# Altium schematic symbol library Sang_library.SchLib: 1607 symbols (part 4 of 15) (continued)
## BIG_Header 4 (continued)
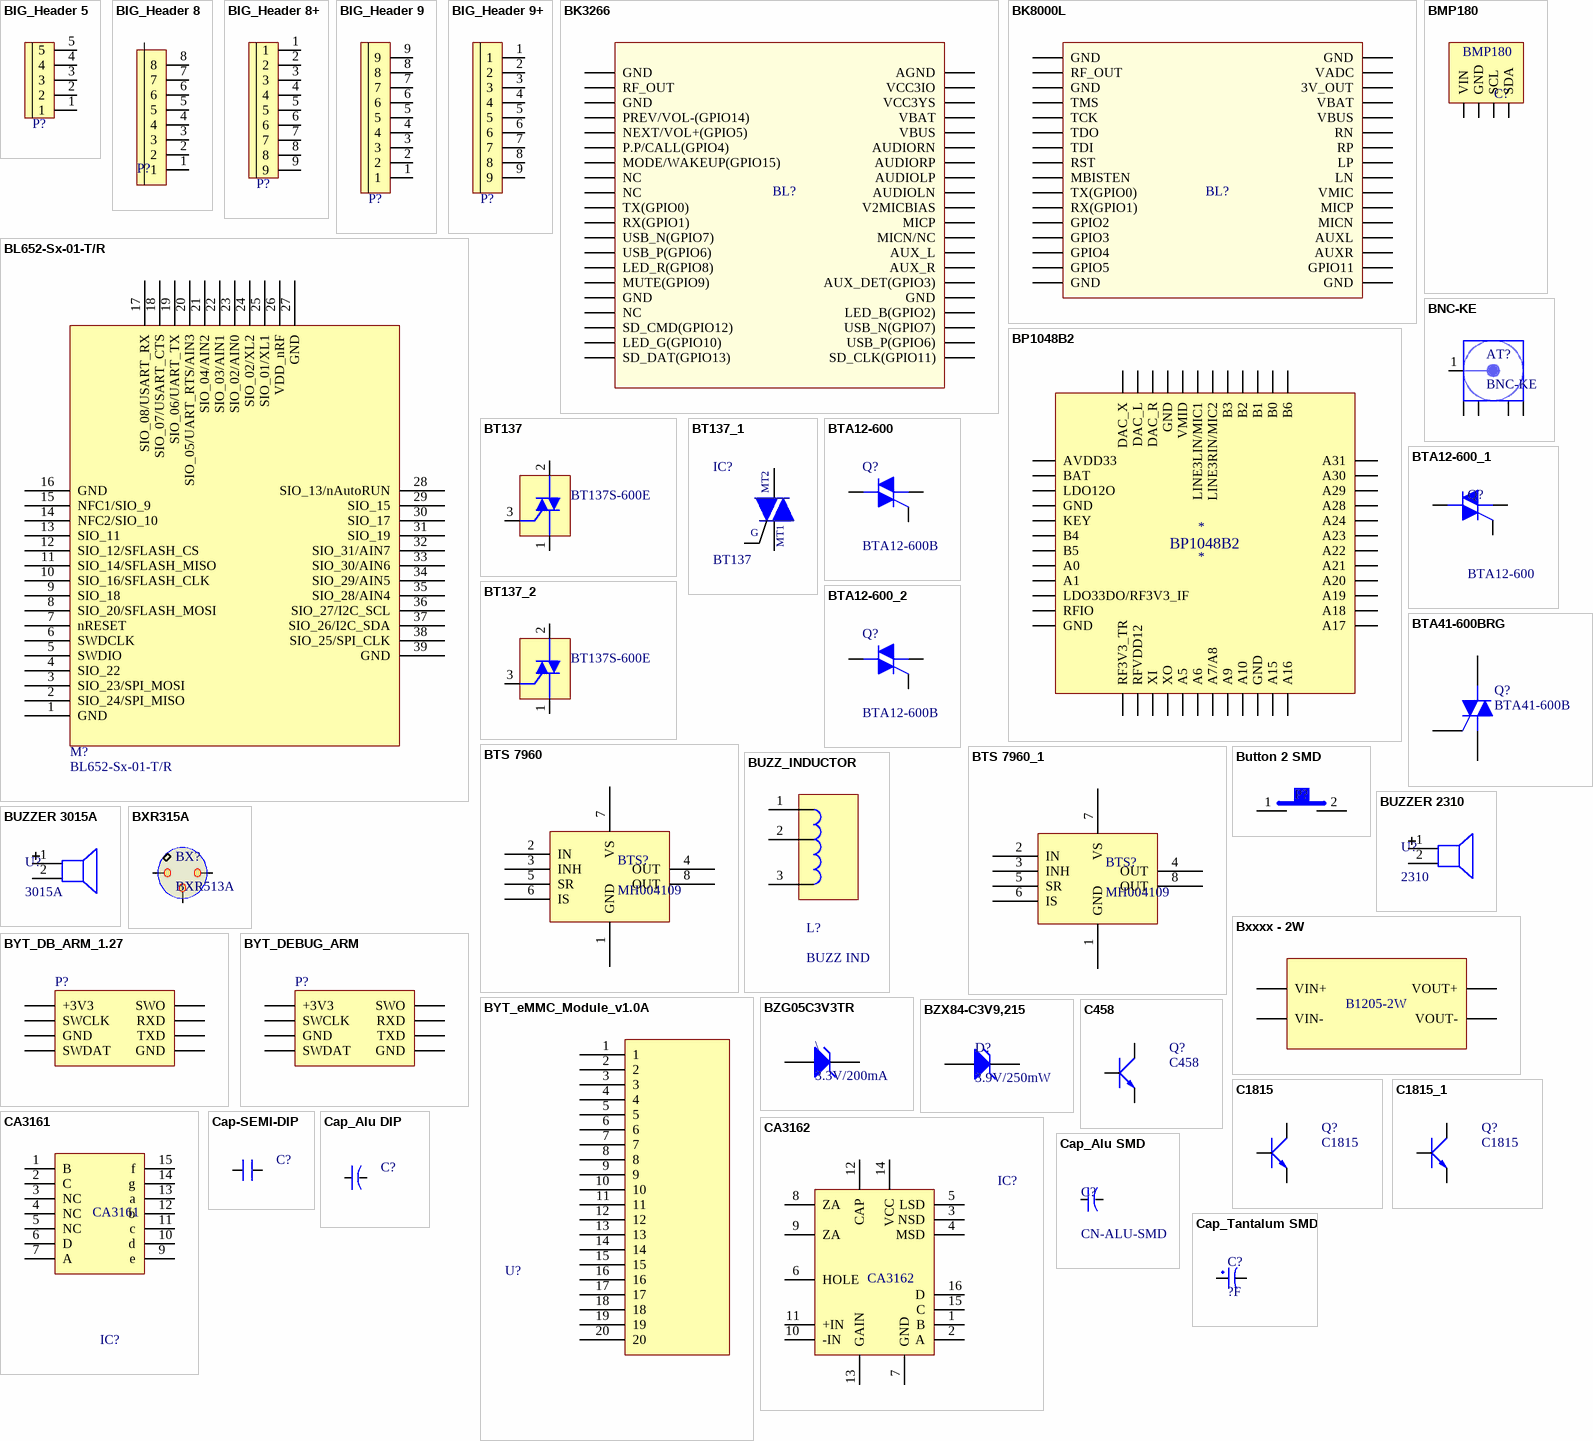
[diagram p25: symbols BIG_Header 5 to Cap_Tantalum SMD]

## BIG_Header 5
designator P?, comment BIG Header 4  (value not drawn)
footprint BIG_Header 5
pins: 1, 2, 3, 4, 5

## BIG_Header 8
designator P?, comment BIG Heager 8  (value not drawn)
footprint BIG_Header 8
pins: 1, 2, 3, 4, 5, 6, 7, 8

## BIG_Header 8+
designator P?, comment BIG Heager 8+  (value not drawn)
footprint BIG_Header 9
pins: 1, 2, 3, 4, 5, 6, 7, 8, 9

## BIG_Header 9
designator P?, comment BIG Heager 9  (value not drawn)
footprint BIG_Header 9
pins: 1, 2, 3, 4, 5, 6, 7, 8, 9

## BIG_Header 9+
designator P?, comment BIG Heager 9+  (value not drawn)
footprint BIG_Header 9
pins: 1, 2, 3, 4, 5, 6, 7, 8, 9

## BK3266
designator BL?  (value not drawn)
footprint BK3266
pins: 1 GND, 2 RF_OUT, 3 GND, 4 PREV/VOL-(GPIO14), 5 NEXT/VOL+(GPIO5), 6 P.P/CALL(GPIO4), 7 MODE/WAKEUP(GPIO15), 8 NC, 9 NC, 10 TX(GPIO0), 11 RX(GPIO1), 12 USB_N(GPIO7), 13 USB_P(GPIO6), 14 LED_R(GPIO8), 15 MUTE(GPIO9), 16 GND, 17 NC, 18 SD_CMD(GPIO12), 19 LED_G(GPIO10), 20 SD_DAT(GPIO13), 21 SD_CLK(GPIO11), 22 USB_P(GPIO6), 23 USB_N(GPIO7), 24 LED_B(GPIO2), 25 GND, 26 AUX_DET(GPIO3), 27 AUX_R, 28 AUX_L, 29 MICN/NC, 30 MICP, 31 V2MICBIAS, 32 AUDIOLN, 33 AUDIOLP, 34 AUDIORP, 35 AUDIORN, 36 VBUS, 37 VBAT, 38 VCC3YS, 39 VCC3IO, 40 AGND

## BK8000L
designator BL?  (value not drawn)
footprint BK8000L
pins: 1 GND, 2 RF_OUT, 3 GND, 4 TMS, 5 TCK, 6 TDO, 7 TDI, 8 RST, 9 MBISTEN, 10 TX(GPIO0), 11 RX(GPIO1), 12 GPIO2, 13 GPIO3, 14 GPIO4, 15 GPIO5, 16 GND, 17 GND, 18 GPIO11, 19 AUXR, 20 AUXL, 21 MICN, 22 MICP, 23 VMIC, 24 LN, 25 LP, 26 RP, 27 RN, 28 VBUS, 29 VBAT, 30 3V_OUT, 31 VADC, 32 GND

## BL652-Sx-01-T/R
designator M?
Solder: SMT; Value: BL652-Sx-01-T/R
footprint BL652-Sx-01-T/R
pins: 1 GND (power), 2 SIO_24/SPI_MISO (power), 3 SIO_23/SPI_MOSI (power), 4 SIO_22 (power), 5 SWDIO (power), 6 SWDCLK (power), 7 nRESET (power), 8 SIO_20/SFLASH_MOSI (power), 9 SIO_18 (power), 10 SIO_16/SFLASH_CLK (power), 11 SIO_14/SFLASH_MISO (power), 12 SIO_12/SFLASH_CS (power), 13 SIO_11 (power), 14 NFC2/SIO_10 (power), 15 NFC1/SIO_9 (power), 16 GND (power), 17 SIO_08/USART_RX (power), 18 SIO_07/USART_CTS (power), 19 SIO_06/UART_TX (power), 20 SIO_05/UART_RTS/AIN3 (power), 21 SIO_04/AIN2 (power), 22 SIO_03/AIN1 (power), 23 SIO_02/AIN0 (power), 24 SIO_02/XL2 (power), 25 SIO_01/XL1 (power), 26 VDD_nRF (power), 27 GND (power), 28 SIO_13/nAutoRUN (power), 29 SIO_15 (power), 30 SIO_17 (power), 31 SIO_19 (power), 32 SIO_31/AIN7 (power), 33 SIO_30/AIN6 (power), 34 SIO_29/AIN5 (power), 35 SIO_28/AIN4 (power), 36 SIO_27/I2C_SCL (power), 37 SIO_26/I2C_SDA (power), 38 SIO_25/SPI_CLK (power), 39 GND (power)

## BMP180
designator C?
Manufacturer: W¨¹rth Elektronik eiSos GmbH; partNo: 613004143121; ComponentLink1 Description: Manufacturer; ComponentLink2 Description: Datasheet; NoPins: 04; Created Date: 29 March 2013; ComponentLink1URL: http://www.we-online.com; ComponentLink2URL: http://katalog.we-online.de/em/datasheet/6130xx143121.pdf; Created by: Karrer Zheng
footprint JP4-C1T (4 row, straight, gold plating)
footprint JP4-D1T (4 pins, 1 row, straight, gold plating)
footprint BMP180
pins: 1 VIN, 2 GND, 3 SCL, 4 SDA

## BNC-KE
designator AT?
Solder: WAVE; MFR_URL: https://detail.tmall.com/item.htm?id=600889032311&ali_refid=a3_430620_1006:1106519694:N:bqURkf1/6XELXFWgHn0phw==:e744e300de7662eb842b86005d159f1e&ali_trackid=1_e744e300de7662eb842b86005d159f1e&spm=a230r.1.14.1&skuId=4376461827836; MPN: BNC-KE
footprint BNC-KE
pins: 1 Signal "Signal Pin", 2 (power), 2 (power), 2 (power), 2 (power)

## BP1048B2
designator *
footprint LQFP48 (7x7mm, Pitch 0.5mm)
pins: 1 AVDD33, 2 BAT, 3 LDO12O, 4 GND, 5 KEY, 6 B4, 7 B5, 8 A0, 9 A1, 10 LDO33DO/RF3V3_IF, 11 RFIO, 12 GND, 13 RF3V3_TR, 14 RFVDD12, 15 XI, 16 XO, 17 A5, 18 A6, 19 A7/A8, 20 A9, 21 A10, 22 GND, 23 A15, 24 A16, 25 A17, 26 A18, 27 A19, 28 A20, 29 A21, 30 A22, 31 A23, 32 A24, 33 A28, 34 A29, 35 A30, 36 A31, 37 B6, 38 B0, 39 B1, 40 B2, 41 B3, 42 LINE3RIN/MIC2, 43 LINE3LIN/MIC1, 44 VMID, 45 GND, 46 DAC_R, 47 DAC_L, 48 DAC_X

## BT137
designator BT?, comment BT137S-600E
Dán; Ten_Linh_Kien: BT137S-600E TO252 TRIAC 8A 600V; Don_Vi: Con; Ma_Hang: MH005450; Ghi_Chu: *; Kieu_Chan: *; Chung_Loai: Dán
footprint TO220AB (TO, Thru-Hole, Vertical, Heatsink Mounted; 3 In-Line Leads; Pitch 2.54 mm; Pin sequence 1, 3, 2)
footprint 7805 (TO, Thru-Hole, Vertical, Heatsink Mounted; 3 In-Line Leads; Pitch 2.54 mm; Pin sequence 1, 3, 2)
footprint TO220 - 1 (TO, Thru-Hole, Vertical, Heatsink Mounted; 3 In-Line Leads; Pitch 2.54 mm; Pin sequence 1, 3, 2)
footprint QTO-220 (TO-220 - 1-2-3)
pins: 1, 2, 3 "Gate"

## BT137_1
designator IC?, comment BT137
Triacs - 8A; Value: LM317
footprint TO220H2 (TO-220 - 1-2-3)
footprint TO220-123 (TO-220 - 1-2-3)
footprint TO220H1 (TO-220 - 1-2-3)
footprint TO220H3 (TO-220 1-2-3)
footprint TO220NH (TO-220 - 1-2-3)
pins: 1 MT1, 2 MT2, 3 IN
text: G

## BT137_2
designator BT?, comment BT137S-600E
Dán; Ten_Linh_Kien: BT137S-600E TO252 TRIAC 8A 600V; Don_Vi: Con; Ma_Hang: MH005450; Ghi_Chu: *; Kieu_Chan: *; Chung_Loai: Dán
footprint TO220AB (TO, Thru-Hole, Vertical, Heatsink Mounted; 3 In-Line Leads; Pitch 2.54 mm; Pin sequence 1, 3, 2)
footprint 7805 (TO, Thru-Hole, Vertical, Heatsink Mounted; 3 In-Line Leads; Pitch 2.54 mm; Pin sequence 1, 3, 2)
footprint TO220 - 1 (TO, Thru-Hole, Vertical, Heatsink Mounted; 3 In-Line Leads; Pitch 2.54 mm; Pin sequence 1, 3, 2)
footprint QTO-220 (TO-220 - 1-2-3)
pins: 1, 2, 3 "Gate"

## BTA12-600
designator Q?, comment BTA12-600B
Dán; Ten_Linh_Kien: BTA12-600B TO220 TRIAC 12A 600V; Don_Vi: Con; Ma_Hang: MH002140; Ghi_Chu: *; Kieu_Chan: *; Chung_Loai: Dán
footprint BTA6-600 (TRIAC BTA6/6A/600V)
pins: 1 M1, 2 M2, 3 G

## BTA12-600_1
designator Q?, comment BTA12-600
Silicon Bidirectional Triode Thyristor; Note: Pin 2 is electrically connected to Pin 4 (TAB); Published: 29-Sep-2000; LatestRevisionDate: 17-Jul-2002; LatestRevisionNote: Re-released for DXP Platform.; DatasheetDocument: 1999; PackageReference: 369-03; Publisher: Altium Limited; Code_JEDEC: TO-251-AA; ComponentLink1Description: Manufacturer Link; ComponentLink1URL: http://www.motorola.com/
footprint TO220H1 (TO-220 - 1-2-3)
footprint TO220-123 (TO-220 - 1-2-3)
footprint TO220NH (TO-220 - 1-2-3)
footprint TO220H2 (TO-220 - 1-2-3)
footprint TO220H3 (TO-220 1-2-3)
pins: 1 M1, 2 M2, 3 G

## BTA12-600_2
designator Q?, comment BTA12-600B
Dán; Ten_Linh_Kien: BTA12-600B TO220 TRIAC 12A 600V; Don_Vi: Con; Ma_Hang: MH002140; Ghi_Chu: *; Kieu_Chan: *; Chung_Loai: Dán
footprint BTA6-600 (TRIAC BTA6/6A/600V)
pins: 1 M1, 2 M2, 3 G

## BTA41-600BRG
designator Q?, comment BTA41-600B
TRIAC 600V 40A TOP3; Manufacturer: STMicroelectronics; Manufacturer Part Number: BTA41-600BRG; BAPartNumber: VT-xxx; SOLD_BY: WAVE; Value: BTA41-600B
footprint TO247+LageHeatsink
pins: 1 M1, 2 M2, 3 G

## BTS 7960
designator BTS?, comment MH004109
Dán; Ten_Linh_Kien: BTS7960B TO263 Half Bridge 40A; Don_Vi: Con; Ghi_Chu: *; Kieu_Chan: *; Ma_Hang: MH004109; Chung_Loai: Dán
footprint TO_263_7
pins: 1 GND, 2 IN, 3 INH, 4 OUT, 5 SR, 6 IS, 7 VS, 8 OUT

## BTS 7960_1
designator BTS?, comment MH004109
Dán; Ten_Linh_Kien: BTS7960B TO263 Half Bridge 40A; Don_Vi: Con; Ghi_Chu: *; Kieu_Chan: *; Ma_Hang: MH004109; Chung_Loai: Dán
footprint TO_263_7
pins: 1 GND, 2 IN, 3 INH, 4 OUT, 5 SR, 6 IS, 7 VS, 8 OUT

## Button 2 SMD
designator P?
SMD Mini Push Button Switch 2 Pin 3x6x2.7mm; MPN: SMD Mini Push Button 2 SMD; Link: https://ram-e-shop.com/product/press2pin-smd/
footprint SW 2P SMD
pins: 1, 2

## BUZZ_INDUCTOR
designator L?, comment BUZZ IND
3 PIN INDUCTOR FOR BUZZER BOOST; MPN: 9*12-680UH+145MH; Solder: WAVE; Value: 9*12-680UH+145MH; MFR_URL: https://item.taobao.com/item.htm?spm=a230r.1.14.22.5e027f5bc13Qjp; MFR: *; Category: INDUCTOR
footprint BUZZ_IND
pins: 1, 2, 3

## BUZZER 2310
designator U?, comment 2310
Loa gốm 23mm - pitch 10mm
footprint BUZZ_23mm
pins: 1, 2

## BUZZER 3015A
designator U?, comment 3015A
footprint BUZZER 3015A
pins: 1, 2

## BXR315A
designator BX?, comment BXR513A
Xtal For RF
footprint BXR315A (Xtal for RF)
pins: 1, 2, 3

## Bxxxx - 2W
designator ?  (value not drawn)
Isolated power 2W
footprint Bxxxx - 2W
pins: 1 VIN+, 2 VIN-, 4 VOUT-, 6 VOUT+
text: B1205-2W

## BYT_DB_ARM_1.27
designator P?
BYTECH DEBUG PORT FOR ARM; Solder: WAVE
footprint IDE8 1.27mm
signal-integrity model Connector
footprint HDR2X4_CEN - 2MM (Connector; Header; 4x2 Position)
pins: 1 +3V3, 2 SWO, 3 SWCLK, 4 RXD, 5 GND, 6 TXD, 7 SWDAT, 8 GND

## BYT_DEBUG_ARM
designator P?
BYTECH DEBUG PORT FOR ARM; Solder: WAVE
footprint HDR2X4_CEN (Connector; Header; 4x2 Position)
signal-integrity model Connector
footprint HDR2X4_CEN - 2MM (Connector; Header; 4x2 Position)
pins: 1 +3V3, 2 SWCLK, 3 GND, 4 SWDAT, 5 SWO, 6 RXD, 7 TXD, 8 GND

## BYT_eMMC_Module_v1.0A
designator U?
MPN: BYT-eMMC; Solder: SMT; Category: IC
footprint BYT-eMMC (Footprint not found)
pins: 1, 2, 3, 4, 5, 6, 7, 8, 9, 10, 11, 12, 13, 14, 15, 16, 17, 18, 19, 20

## BZG05C3V3TR
designator \, comment 3.3V/200mA
DIODE ZENER 3.3V 1.25W 200mA  DO214AC; MPN: BZG05C3V3TR; CompanyID: VT-00944; Solder: SMT; Value: 3.3V/200mA
footprint DIODE_DO214AC_SMA (Diode 2214AC)
pins: 1 A, 2 K

## BZX84-C3V9,215
designator D?, comment 3.9V/250mW
DIODE ZENER 3.9V 250MW SOT23; MPN: BZX84-C3V9,215; Solder: SMT; CompanyID: VT-00751; Value: 3.9V/250mW
footprint SOT23_3 (SOT23, 3-Leads, Body 2,90x2,30mm, Pitch 0,95mm, IPC Medium Density)
pins: 1 A, 2 K

## C458
designator Q?
NPN 600mW, ECB; Value: C1815
footprint TO92-123 (TO-92)
footprint SOT23-321
footprint TO92-123 - 1 (TO-92)
footprint TO92-123 - 2 (TO-92)
footprint TO92-123 - 3 (TO-92)
pins: 1 E, 2 C, 3 B

## C1815
designator Q?
Dán; Ten_Linh_Kien: C1815 SOT23 TRANS NPN 0.15A 50V (SMD-HF); Don_Vi: Con; Ma_Hang: MH000946; Ghi_Chu: *; Kieu_Chan: *; Chung_Loai: Dán
footprint QTO-92 (TO-92)
footprint SOT23B (SOT 23B)
footprint SOT23B (SOT 23B)
pins: 1 B, 2 C, 3 E

## C1815_1
designator Q?, comment C1815
Dán; Ten_Linh_Kien: C1815 SOT23 TRANS NPN 0.15A 50V (SMD-HF); Don_Vi: Con; Ma_Hang: MH000946; Ghi_Chu: *; Kieu_Chan: *; Chung_Loai: Dán
footprint QTO-92 (TO-92)
footprint SOT23B (SOT 23B)
footprint SOT23B (SOT 23B)
pins: 1 B, 2 C, 3 E

## CA3161
designator IC?
Decoder BCD to 7segAC; Value: CA3161
footprint DIP16
pins: 1 B, 2 C, 3 NC, 4 NC, 5 NC, 6 D, 7 A, 8 GND (power) hidden to GND, 9 e, 10 d, 11 c, 12 b, 13 a, 14 g, 15 f, 16 VCC (power) hidden to VCC

## CA3162
designator IC?
ADC to BCDx3; Value: CA3162
footprint DIP16
pins: 1 B, 2 A, 3 NSD, 4 MSD, 5 LSD, 6 HOLE, 7 GND (power), 8 ZA, 9 ZA, 10 -IN, 11 +IN, 12 CAP, 13 GAIN, 14 VCC (power), 15 C, 16 D

## Cap-SEMI-DIP
designator C?
Capacitor (Semiconductor SIM Model); Value: 104; LatestRevisionDate: 17-Jul-2002; LatestRevisionNote: Re-released for DXP Platform.; PackageReference: C1206; Publisher: Altium Limited
footprint C-SE-7,5x10x9x5x4 (Film Capacitors, 2-Leads, Body 7,5x10x9x5)
footprint C-SE-7,5x11x13x9x4 (Film Capacitors, 2-Leads, Body 7,5x11x13x9)
footprint C-SE-10x12,5x20x10x4 (Film Capacitors, 2-Leads, Body 10x12,5x20x10)
footprint C-SE-10x13x12x6x4 (Film Capacitors, 2-Leads, Body 10x13x12x6)
footprint C-SE-12,5x15x16x10x4 (Film Capacitors, 2-Leads, Body 12,5x15x16x10)
footprint C-SE-15x18x13,5x6,5x4 (Film Capacitors, 2-Leads, Body 15x18x13,5x6,5)
footprint C-SE-15x18x17,5x10x4 (Film Capacitors, 2-Leads, Body 15x18x17,5x10)
footprint C-SE-22,5x26x20x11x4 (Film Capacitors, 2-Leads, Body 22,5x26x20x11)
footprint C-SE-27,5x31x29x15,5x4 (Film Capacitors, 2-Leads, Body 27,5x31x29x15,5)
footprint C-SE-37,5x41,5x35,5x22,5x4 (Film Capacitors, 2-Leads, Body 37,5x41,5x35,5x22,5)
pins: 1, 2

## Cap_Alu DIP
designator C?, comment NameType  (value not drawn)
Capacitor (Semiconductor SIM Model); Value: 104; LatestRevisionDate: 17-Jul-2002; LatestRevisionNote: Re-released for DXP Platform.; PackageReference: C1206; Publisher: Altium Limited
footprint CA-ALU-2.54
footprint CA-ALU-5 (Polarized capacitors, Aluminum Electrolytic Capacitors, 2-Leads, Body 5x11x2x0.5)
footprint CA-ALU-5B (Polarized capacitors, Aluminum Electrolytic Capacitors, 2-Leads, Body 5x11x2x0.5)
footprint CA-ALU-5L (Polarized capacitors, Aluminum Electrolytic Capacitors, 2-Leads, Body 5x11x2x0.5)
footprint CA-ALU-5R
footprint CA-ALU-5W (Tu hoa < 22uF/16>50V)
footprint CA-ALU-6.3 (Polarized capacitors, Aluminum Electrolytic Capacitors, 2-Leads, Body 6.3x15x2.5x0.5)
footprint CA-ALU-8 (Polarized capacitors, Aluminum Electrolytic Capacitors, 2-Leads, Body 8x16x3.5x0.5)
footprint CA-ALU-8R (Polarized capacitors, Aluminum Electrolytic Capacitors, 2-Leads, Body 8x16x3.5x0.5)
footprint CA-ALU-10 (Polarized capacitors, Aluminum Electrolytic Capacitors, 2-Leads, Body 10x20x5x0.6)
footprint CA-ALU-10R (Polarized capacitors, Aluminum Electrolytic Capacitors, 2-Leads, Body 10x20x5x0.6)
footprint CA-ALU-10RL (Polarized capacitors, Aluminum Electrolytic Capacitors, 2-Leads, Body 10x20x5x0.6)
footprint CA-ALU-13BL (Polarized capacitors, Aluminum Electrolytic Capacitors, 2-Leads, Body 13x35x5x0.6)
footprint CA-ALU-13R (Polarized capacitors, Aluminum Electrolytic Capacitors, 2-Leads, Body 13x35x5x0.6)
footprint CA-ALU-16 (Polarized capacitors, Aluminum Electrolytic Capacitors, 2-Leads, Body 16x21x7.5x0.8)
footprint CA-ALU-16H (Polarized capacitors, Aluminum Electrolytic Capacitors, 2-Leads, Body 16x31.5x7.5x0.8)
footprint CA-ALU-18 (Polarized capacitors, Aluminum Electrolytic Capacitors, 2-Leads, Body 18x35.5x7.5x0.8)
footprint CA-ALU-18BL (Polarized capacitors, Aluminum Electrolytic Capacitors, 2-Leads, Body 18x35.5x7.5x0.8)
footprint CA-ALU-18RH (Polarized capacitors, Aluminum Electrolytic Capacitors, 2-Leads, Body 18x35.5x7.5x0.8)
footprint CA-ALU-25 (Polarized capacitors, Aluminum Electrolytic Capacitors, 2-Leads, Body 22x41x10x0.8)
footprint CA-ALU-28 (Polarized capacitors, Aluminum Electrolytic Capacitors, 2-Leads, Body 22x41x10x0.8)
footprint CA-ALU-30 (Polarized capacitors, Aluminum Electrolytic Capacitors, 2-Leads, Body 22x41x10x0.8)
footprint CA-ALU-35L (Polarized capacitors, Aluminum Electrolytic Capacitors, 2-Leads, Body 22x41x10x0.8)
footprint CA-ALU-4 (Polarized capacitors, Aluminum Electrolytic Capacitors, 2-Leads, Body 5x11x2x0.5)
footprint CA-ALU-6.3R (Polarized capacitors, Aluminum Electrolytic Capacitors, 2-Leads, Body 6.3x15x2.5x0.5)
footprint CA-ALU-10BL (Polarized capacitors, Aluminum Electrolytic Capacitors, 2-Leads, Body 10x20x5x0.6)
footprint CA-ALU-10GR (Polarized capacitors, Aluminum Electrolytic Capacitors, 2-Leads, Body 10x20x5x0.6)
footprint CA-ALU-18R (Polarized capacitors, Aluminum Electrolytic Capacitors, 2-Leads, Body 18x35.5x7.5x0.8)
footprint CA-ALU-28R (Polarized capacitors, Aluminum Electrolytic Capacitors, 2-Leads, Body 22x41x10x0.8)
footprint CA-ALU-10 NGANG (Polarized capacitors, Aluminum Electrolytic Capacitors, 2-Leads, Body 10x20x5x0.6)
pins: 1, 2

## Cap_Alu SMD
designator C?, comment CN-ALU-SMD
Polarized Capacitor (Axial); Published: 8-Jun-2000; LatestRevisionDate: 17-Jul-2002; LatestRevisionNote: Re-released for DXP Platform.; PackageReference: POLAR0.8; Publisher: Altium Limited
footprint CAP-ALU-SMD-4.5x5x1.4
footprint CAP-ALU-SMD-5x5.5x1.4
footprint CAP-ALU-SMD-5.5x5.5
footprint CAP-ALU-SMD-6.3x7.7x2.2
footprint CAP-ALU-SMD-C
footprint CAP-ALU-SMD-D
footprint CAP-ALU-SMD-F
footprint CAP-ALU-SMD-G
footprint CAP-ALU-SMD-H
footprint CAP-ALU-SMD-J
footprint CAP-ALU-SMD-K
pins: 1, 2
1 alternate drawing of the same symbol

## Cap_Tantalum SMD
designator C?, comment ?F
SMD; Chung_Loai: Dán; Don_Vi: Con; So_Chan: 2; Ten_Linh_Kien: Tụ tantalum 477A-470uF 10V SMD7343; Ma_Hang: MH001956; Kieu_Chan: *
footprint SMD7343
footprint SMD6032
footprint SMD3528
footprint SMD3216
footprint TANTALUM_SMD_1206
pins: 1, 2

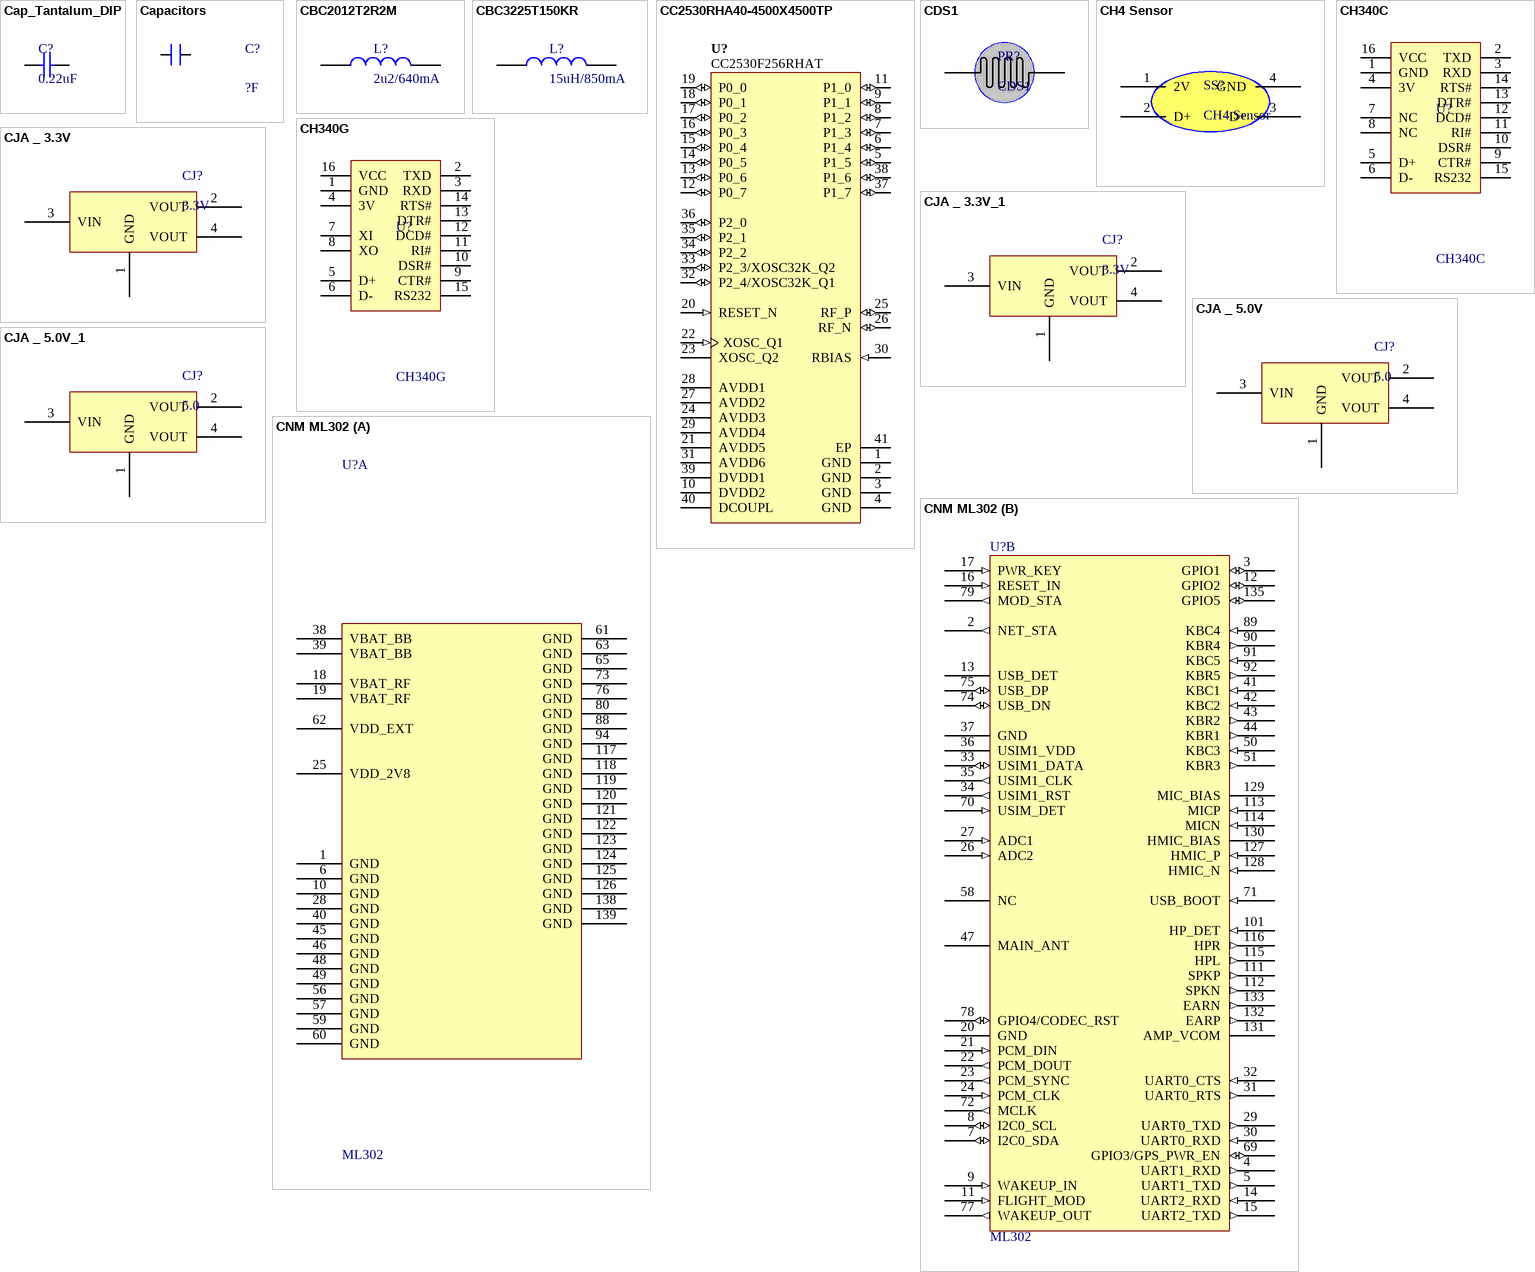
[diagram p26: symbols Cap_Tantalum_DIP to CNM ML302]

## Cap_Tantalum_DIP
designator C?, comment 0.22uF
DIP; Chung_Loai: Cắm; Don_Vi: Con; So_Chan: 2; Ten_Linh_Kien: Tụ tantalum 224-0.22uF 50V DIP5.08 sứ vàng; Ma_Hang: MH007473; Kieu_Chan: *
footprint TANTALUM_DIP_5.08
footprint TANTALUM_DIP_2.54
pins: 1, 2

## Capacitors
designator C?, comment ?F
Value: 33pF
footprint CN1.5
footprint CN1
footprint CN2.5 (Tu pin to pin 250mil)
footprint CN3 (Cap np W 0.3)
footprint CN-SMD-0603
footprint CN-SMD-0805
footprint CN-SMD-0402
footprint CN-SMD-1206
footprint CN-SMD-2520 (TOKO INDUCTOR DFE252012 SERIES)
footprint CN-SMD-3225 (Chip Capacitor, Body 3.2x2.5mm, IPC Medium Density)
footprint CN2-T
footprint CN2-G
footprint CN0.8
footprint CN1-TA
footprint CN2-B
footprint CN2-LT
footprint CN2-O
footprint CN2-R
footprint CN2.5-BR (Tu pin to pin 250mil)
footprint CN2.5-R (Tu pin to pin 250mil)
footprint CN2.5-RV (Tu pin to pin 250mil)
footprint CN3.5 (Cap np W 0.3)
footprint CN4
footprint CN7 (Cap np W 0.3)
footprint CN3-B (Cap np W 0.3)
footprint CN7-B (Cap np W 0.3)
footprint CN7-N (Cap np W 0.3)
footprint CN7-Y (Cap np W 0.3)
footprint CN15 (Cap np W 0.3)
pins: 1, 2

## CBC2012T2R2M
designator L?, comment 2u2/640mA
IND-FIXED 2.2uH 20% 640mA 429 mOHM 0805; MPN: CBC2012T2R2M; CompanyID: VT-01204; Solder: SMT; Value: 2u2/640mA; Category: CAPACITOR; PinCount: 2
footprint IND-0805 (2012) (Resistor, Chip; 2.00 mm L X 1.25 mm W X 0.70 mm H body)
pins: 1, 2

## CBC3225T150KR
designator L?, comment 15uH/850mA
FIXED IND 15UH 850MA 253.5 MOHM; MPN: CBC3225T150KR; MFR: Taiyo Yuden; Solder: SMT; Value: 15uH/850mA; Category: INDUCTOR
footprint IND-1210 (3225) (Resistor, Chip; 3.10 mm L X 2.60 mm W X 0.90 mm H body)
pins: 1, 2

## CC2530RHA40-4500X4500TP
designator U?, comment CC2530F256RHAT
CC2530 System-on-Chip Solution for 2.4-GHz IEEE 802.15.4 and ZigBee Applications; Manufacturer: Texas Instruments; Pin/Package: 40VQFN; Operating Voltage (Max) (V): 3.6; Sensitivity (Best) (dBm): -97; Wakeup Time (PD-->RX/TX) (us): 600; Operating Voltage (Min) (V): 2; Modulation Techniques: DSSS; Antenna Connection: Differential; Standby Current (uA): 0.4; TX Power (dBm): 4.5; RX Current (Lowest) (mA): 20.5; Flash size (KB): 256; Data Rate (Max) (kbps): 250; RAM Size (KB): 8; Frequency Range: 2.4GHz; ComponentLink2Description: Datasheet; PackageReference: S-PVQFN-N40; ComponentLink3URL: http://www.ti.com/lit/ml/mpqf135c/mpqf135c.pdf; ComponentLink1Description: Manufacturer URL; DatasheetVersion: SWRS081B; PartNumber: CC2530F256RHAT; Device Type: System-on-Chip; PackageDescription: 40-Pin Quad Flat No-Lead Package, Body 6 x 6mm, Pitch 0.5mm; ComponentLink1URL: http://www.ti.com/; ComponentLink2URL: http://www.ti.com/lit/ds/symlink/cc2530.pdf; Mounting Technology: Surface Mount; ComponentLink3Description: Package Specification; PackageVersion: 4204276/E
footprint QFN40 (QFN, 40-Leads, Body 6x6mm, Pitch 0.5mm, Thermal Pad 4.5x4.5mm)
pins: 1 GND (power) "Connect to GND", 2 GND (power) "Connect to GND", 3 GND (power) "Connect to GND", 4 GND (power) "Connect to GND", 5 P1_5 (io) "Port 1.5", 6 P1_4 (io) "Port 1.4", 7 P1_3 (io) "Port 1.3", 8 P1_2 (io) "Port 1.2", 9 P1_1 (io) "Port 1.1 ?20-mA drive capability", 10 DVDD2 (power) "2-V?.6-V digital power-supply connection", 11 P1_0 (io) "Port 1.0 ?20-mA drive capability", 12 P0_7 (io) "Port 0.7", 13 P0_6 (io) "Port 0.6", 14 P0_5 (io) "Port 0.5", 15 P0_4 (io) "Port 0.4", 16 P0_3 (io) "Port 0.3", 17 P0_2 (io) "Port 0.2", 18 P0_1 (io) "Port 0.1", 19 P0_0 (io) "Port 0.0", 20 RESET_N (in) "Reset, active-low", 21 AVDD5 (power) "2-V?.6-V analog power-supply connection", 22 XOSC_Q1 (in) "32-MHz crystal oscillator pin 1 or external-clock input", 23 XOSC_Q2 "32-MHz crystal oscillator pin 2", 24 AVDD3 (power) "2-V?.6-V analog power-supply connection", 25 RF_P (io) "Positive RF input signal to LNA during RX Positive RF output signal from PA during TX", 26 RF_N (io) "Negative RF input signal to LNA during RX Negative RF output signal from PA during TX", 27 AVDD2 (power) "2-V?.6-V analog power-supply connection", 28 AVDD1 (power) "2-V?.6-V analog power-supply connection", 29 AVDD4 (power) "2-V?.6-V analog power-supply connection", 30 RBIAS (in) "External precision bias resistor for reference current", 31 AVDD6 (power) "2-V?.6-V analog power-supply connection", 32 P2_4/XOSC32K_Q1 (io) "Port 2.4/32.768 kHz XOSC", 33 P2_3/XOSC32K_Q2 (io) "Port 2.3/32.768 kHz XOSC", 34 P2_2 (io) "Port 2.2", 35 P2_1 (io) "Port 2.1", 36 P2_0 (io) "Port 2.0", 37 P1_7 (io) "Port 1.7", 38 P1_6 (io) "Port 1.6", 39 DVDD1 (power) "2-V?.6-V digital power-supply connection", 40 DCOUPL (power) "1.8-V digital power-supply decoupling. Do not use for supplying external circuits.", 41 EP (power) "The ground pad must be connected to a solid ground plane."

## CDS1
designator PR?
Photoresistor; Creator: Bien Nguyen
footprint LED-5-WHITE (LED 2 PIN, 5 ly , Only colour, pin to pin 110mil)
pins: 1, 2